# Altium footprint library iMag.PcbLib: 77 footprints (part 3 of 5)
Each footprint in its own frame and in the unit in brackets; x right, y up, seen from the top. Pads: shape width x height; smd on the part's side, far side on the other; paste and mask are expansions set on the pad; w line width, h text height; cw(c..) or ccw(c..) is an arc to the next point about the centre after c.
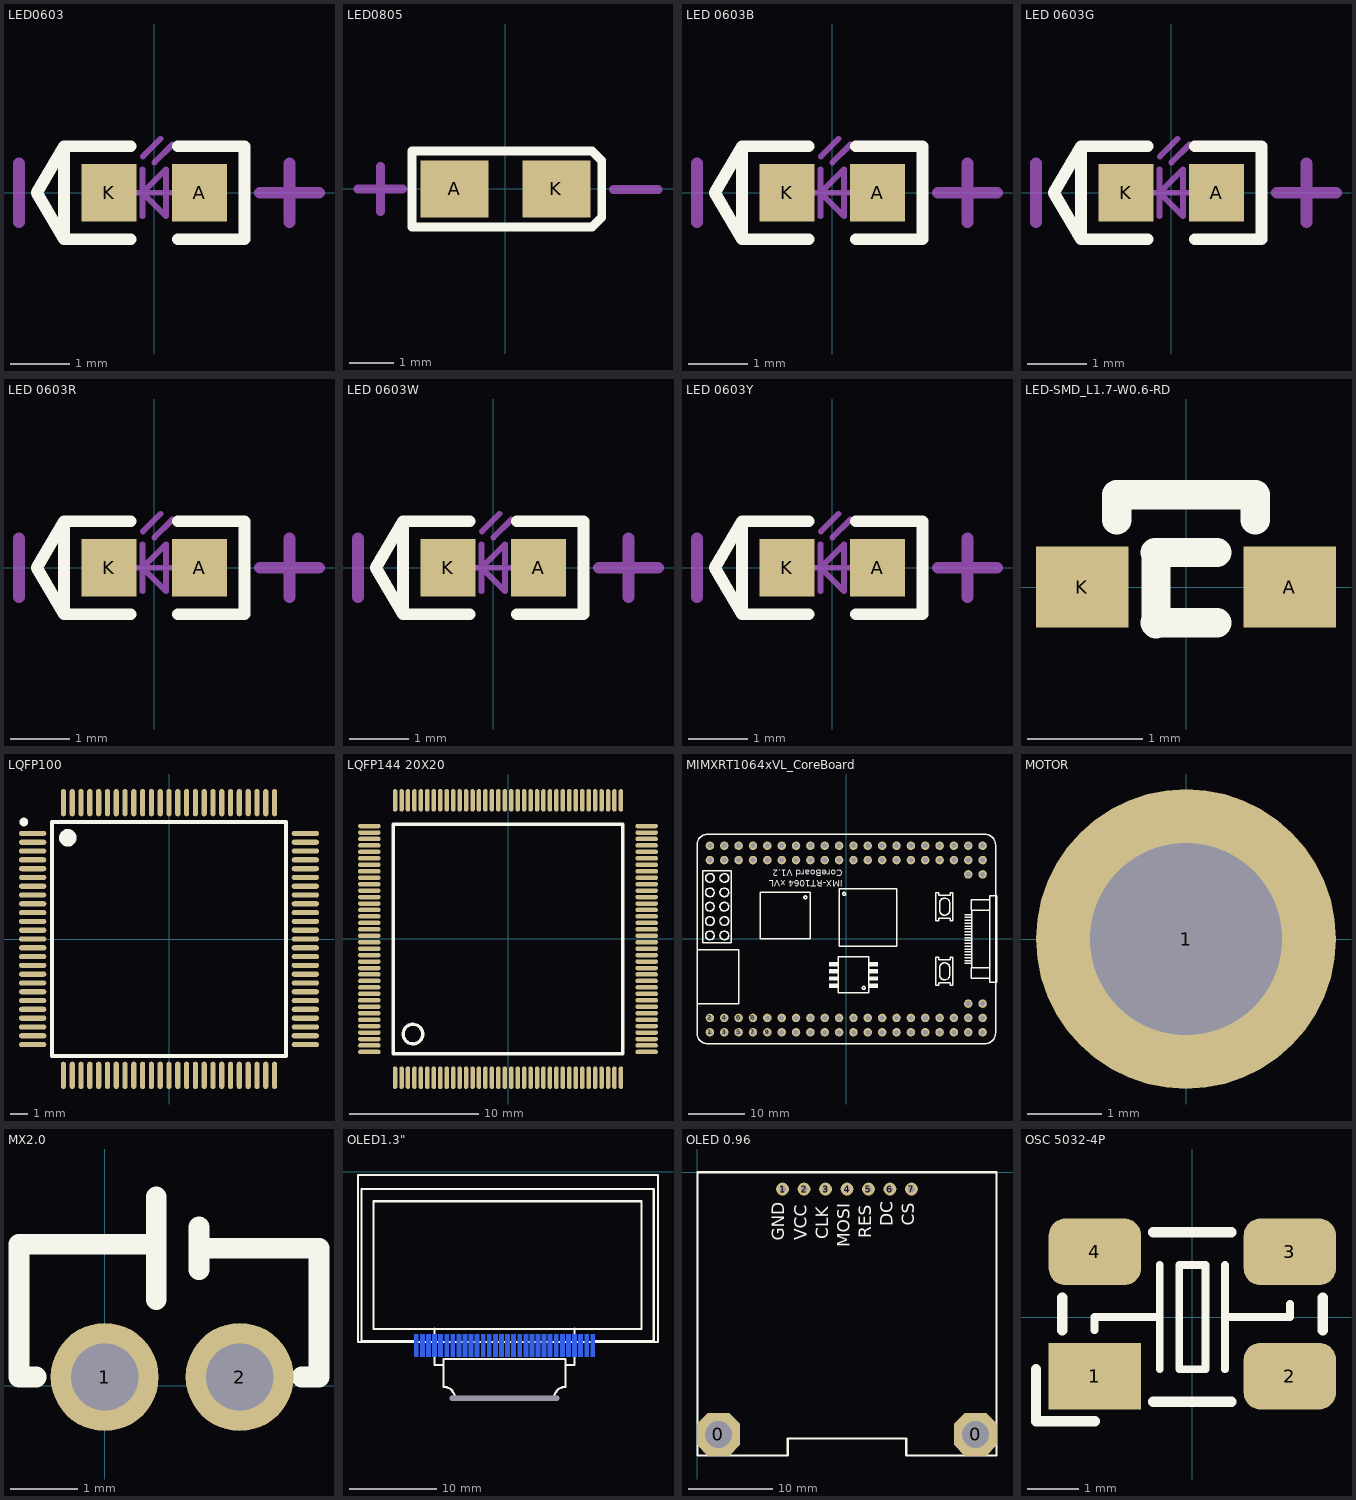
[diagram p2: the footprints below, top view; thin cyan lines are the x and y axes]

## LED0603 [mm]
pads (2):
  rect 0.93x0.98 smd: A(0.77,0) K(-0.77,0)
Top Overlay:
  lines w0.2: -0.4,-0.79 -1.535,-0.79 ; -0.4,0.79 -1.535,0.79 ; 0.4,-0.79 1.535,-0.79 1.535,0.79 0.4,0.79 ; -1.535,-0.79 -2,0 -1.535,0.79 ; -1.535,-0.79 -1.535,0.79
Mechanical 13:
  lines w0.1: -0.4,0 0.4,0 ; -0.2,-0.4 -0.2,0.4 ; -0.195,0.617 0.105,0.917 ; 0.005,0.517 0.305,0.817 ; -0.2,0 0.2,0.4 0.2,-0.4 -0.2,0
Mechanical 15:
  lines w0.203: -2.3,-0.5 -2.3,0.5 ; 1.8,0 2.8,0 ; 2.3,-0.5 2.3,0.5
3D body "User Library-LED_0603_R.STEP": height 0.6, standoff 0, extent -0.8,-0.4 0.8,0.4

## LED0805 [mil]
pads (2):
  rect 60x50 smd: A(-45,0) K(45,0)
Top Overlay:
  lines w7.87: -82.68,-33.46 76.54,-33.46 85,-25 85,25 76.54,33.46 75,33.46 -82.68,33.46 -82.68,-33.46
Mechanical 15:
  lines w8: -130.24,0 -90.87,0 ; -110.55,-19.69 -110.55,19.68 ; 95.31,-0.55 134.68,-0.55
3D body "User Library-LED SMD0805.step": height 33.45, standoff 0.23, extent -40.6,-17.84 40.6,17.84

## LED 0603B [mm] "蓝色0603LED"
pads (2):
  rect 0.93x0.98 smd: A(0.77,0) K(-0.77,0)
Top Overlay:
  lines w0.2: -0.4,-0.79 -1.535,-0.79 ; -0.4,0.79 -1.535,0.79 ; 0.4,-0.79 1.535,-0.79 1.535,0.79 0.4,0.79 ; -1.535,-0.79 -1.535,0.79 ; -1.535,-0.79 -2,0 -1.535,0.79
Mechanical 13:
  lines w0.1: -0.4,0 0.4,0 ; -0.2,-0.4 -0.2,0.4 ; -0.195,0.617 0.105,0.917 ; 0.005,0.517 0.305,0.817 ; -0.2,0 0.2,-0.4 0.2,0.4 -0.2,0
Mechanical 15:
  lines w0.203: -2.3,-0.5 -2.3,0.5 ; 1.8,0 2.8,0 ; 2.3,-0.5 2.3,0.5
3D body "LED 0603-B.STEP": height 0.47, standoff 0, extent -0.8,-0.401 0.8,0.401
3D body "LED 0603玻璃罩.STEP": height 0.61, standoff 0.21, extent -0.599,-0.401 0.599,0.401

## LED 0603G [mm] "绿色0603LED"
pads (2):
  rect 0.93x0.98 smd: A(0.77,0) K(-0.77,0)
Top Overlay:
  lines w0.2: -0.4,-0.79 -1.535,-0.79 ; -0.4,0.79 -1.535,0.79 ; 0.4,-0.79 1.535,-0.79 1.535,0.79 0.4,0.79 ; -1.535,-0.79 -2,0 -1.535,0.79 ; -1.535,-0.79 -1.535,0.79
Mechanical 13:
  lines w0.1: -0.4,0 0.4,0 ; -0.2,-0.4 -0.2,0.4 ; -0.195,0.617 0.105,0.917 ; 0.005,0.517 0.305,0.817 ; -0.2,0 0.2,0.4 0.2,-0.4 -0.2,0
Mechanical 15:
  lines w0.203: -2.3,-0.5 -2.3,0.5 ; 1.8,0 2.8,0 ; 2.3,-0.5 2.3,0.5
3D body "LED 0603玻璃罩.STEP": height 0.61, standoff 0.21, extent -0.599,-0.401 0.599,0.401
3D body "LED 0603-G.STEP": height 0.47, standoff 0, extent -0.8,-0.401 0.8,0.401

## LED 0603R [mm] "红色0603LED"
pads (2):
  rect 0.93x0.98 smd: A(0.77,0) K(-0.77,0)
Top Overlay:
  lines w0.2: -0.4,-0.79 -1.535,-0.79 ; -0.4,0.79 -1.535,0.79 ; 0.4,-0.79 1.535,-0.79 1.535,0.79 0.4,0.79 ; -1.535,-0.79 -2,0 -1.535,0.79 ; -1.535,-0.79 -1.535,0.79
Mechanical 13:
  lines w0.1: -0.4,0 0.4,0 ; -0.2,-0.4 -0.2,0.4 ; -0.195,0.617 0.105,0.917 ; 0.005,0.517 0.305,0.817 ; -0.2,0 0.2,0.4 0.2,-0.4 -0.2,0
Mechanical 15:
  lines w0.203: -2.3,-0.5 -2.3,0.5 ; 1.8,0 2.8,0 ; 2.3,-0.5 2.3,0.5
3D body "LED 0603-R.STEP": height 0.47, standoff 0, extent -0.8,-0.401 0.8,0.401
3D body "LED 0603玻璃罩.STEP": height 0.61, standoff 0.21, extent -0.599,-0.401 0.599,0.401

## LED 0603W [mm] "白色0603LED"
pads (2):
  rect 0.93x0.98 smd: A(0.77,0) K(-0.77,0)
Top Overlay:
  lines w0.2: -0.4,-0.79 -1.535,-0.79 ; -0.4,0.79 -1.535,0.79 ; 0.4,-0.79 1.535,-0.79 1.535,0.79 0.4,0.79 ; -1.535,-0.79 -2,0 -1.535,0.79 ; -1.535,-0.79 -1.535,0.79
Mechanical 13:
  lines w0.1: -0.4,0 0.4,0 ; -0.2,-0.4 -0.2,0.4 ; -0.195,0.617 0.105,0.917 ; 0.005,0.517 0.305,0.817 ; -0.2,0 0.2,0.4 0.2,-0.4 -0.2,0
Mechanical 15:
  lines w0.203: -2.3,-0.5 -2.3,0.5 ; 1.8,0 2.8,0 ; 2.3,-0.5 2.3,0.5
3D body "LED 0603玻璃罩.STEP": height 0.61, standoff 0.21, extent -0.599,-0.401 0.599,0.401
3D body "LED 0603-W.STEP": height 0.47, standoff 0, extent -0.8,-0.401 0.8,0.401

## LED 0603Y [mm] "黄色0603LED"
pads (2):
  rect 0.93x0.98 smd: A(0.77,0) K(-0.77,0)
Top Overlay:
  lines w0.2: -0.4,-0.79 -1.535,-0.79 ; -0.4,0.79 -1.535,0.79 ; 0.4,-0.79 1.535,-0.79 1.535,0.79 0.4,0.79 ; -1.535,-0.79 -2,0 -1.535,0.79 ; -1.535,-0.79 -1.535,0.79
Mechanical 13:
  lines w0.1: -0.4,0 0.4,0 ; -0.2,-0.4 -0.2,0.4 ; -0.195,0.617 0.105,0.917 ; 0.005,0.517 0.305,0.817 ; -0.2,0 0.2,0.4 0.2,-0.4 -0.2,0
Mechanical 15:
  lines w0.203: -2.3,-0.5 -2.3,0.5 ; 1.8,0 2.8,0 ; 2.3,-0.5 2.3,0.5
3D body "LED 0603玻璃罩.STEP": height 0.61, standoff 0.21, extent -0.599,-0.401 0.599,0.401
3D body "LED 0603-Y.STEP": height 0.47, standoff 0, extent -0.8,-0.408 0.8,0.395

## LED-SMD_L1.7-W0.6-RD [mm]
pads (2):
  rect 0.8x0.7 smd: A(0.9,0) K(-0.9,0)
Top Overlay:
  lines w0.254: -0.6,0.581 -0.6,0.8 0.6,0.8 0.6,0.581 ; -0.269,-0.31 0.269,-0.31 ; -0.269,0.3 0.269,0.3 ; -0.26,-0.32 -0.26,0.279
3D body "LED 0603玻璃罩.STEP": height 0.61, standoff 0.21, extent -0.599,-0.401 0.599,0.401
3D body "LED 0603-G.STEP": height 0.47, standoff 0, extent -0.8,-0.401 0.8,0.401

## LQFP100 [mm] "100-pin low-profile quad flat"
pads (100):
  oval 1.55x0.3 smd: 1(-7.75,6) 2(-7.75,5.5) 3(-7.75,5) 4(-7.75,4.5) 5(-7.75,4) 6(-7.75,3.5) 7(-7.75,3) 8(-7.75,2.5) 9(-7.75,2) 10(-7.75,1.5) 11(-7.75,1) 12(-7.75,0.5) 13(-7.75,0) 14(-7.75,-0.5) 15(-7.75,-1) 16(-7.75,-1.5) 17(-7.75,-2) 18(-7.75,-2.5) 19(-7.75,-3) 20(-7.75,-3.5) 21(-7.75,-4) 22(-7.75,-4.5) 23(-7.75,-5) 24(-7.75,-5.5) 25(-7.75,-6) 51(7.75,-6) 52(7.75,-5.5) 53(7.75,-5) 54(7.75,-4.5) 55(7.75,-4) 56(7.75,-3.5) 57(7.75,-3) 58(7.75,-2.5) 59(7.75,-2) 60(7.75,-1.5) 61(7.75,-1) 62(7.75,-0.5) 63(7.75,0) 64(7.75,0.5) 65(7.75,1) 66(7.75,1.5) 67(7.75,2) 68(7.75,2.5) 69(7.75,3) 70(7.75,3.5) 71(7.75,4) 72(7.75,4.5) 73(7.75,5) 74(7.75,5.5) 75(7.75,6)
  oval 0.3x1.55 smd: 26(-6,-7.75) 27(-5.5,-7.75) 28(-5,-7.75) 29(-4.5,-7.75) 30(-4,-7.75) 31(-3.5,-7.75) 32(-3,-7.75) 33(-2.5,-7.75) 34(-2,-7.75) 35(-1.5,-7.75) 36(-1,-7.75) 37(-0.5,-7.75) 38(0,-7.75) 39(0.5,-7.75) 40(1,-7.75) 41(1.5,-7.75) 42(2,-7.75) 43(2.5,-7.75) 44(3,-7.75) 45(3.5,-7.75) 46(4,-7.75) 47(4.5,-7.75) 48(5,-7.75) 49(5.5,-7.75) 50(6,-7.75) 76(6,7.75) 77(5.5,7.75) 78(5,7.75) 79(4.5,7.75) 80(4,7.75) 81(3.5,7.75) 82(3,7.75) 83(2.5,7.75) 84(2,7.75) 85(1.5,7.75) 86(1,7.75) 87(0.5,7.75) 88(0,7.75) 89(-0.5,7.75) 90(-1,7.75) 91(-1.5,7.75) 92(-2,7.75) 93(-2.5,7.75) 94(-3,7.75) 95(-3.5,7.75) 96(-4,7.75) 97(-4.5,7.75) 98(-5,7.75) 99(-5.5,7.75) 100(-6,7.75)
Top Overlay:
  circle w0.25: c-8.25,6.65 r0.125
  circle w0.5: c-5.75,5.75 r0.25
  lines w0.2: -6.65,-6.65 6.65,-6.65 6.65,6.65 -6.65,6.65 -6.65,-6.65
3D body "User Library-LQFP100.step": height 1.6, standoff 0, extent -8,-8 8,8

## LQFP144 20X20 [mm]
height 1.1
pads (144):
  oval 0.35x1.753 smd: 1(-8.75,-10.747) 2(-8.25,-10.747) 3(-7.75,-10.747) 4(-7.25,-10.747) 5(-6.75,-10.747) 6(-6.25,-10.747) 7(-5.75,-10.747) 8(-5.25,-10.747) 9(-4.75,-10.747) 10(-4.25,-10.747) 11(-3.75,-10.747) 12(-3.25,-10.747) 13(-2.75,-10.747) 14(-2.25,-10.747) 15(-1.75,-10.747) 16(-1.25,-10.747) 17(-0.75,-10.747) 18(-0.25,-10.747) 19(0.25,-10.747) 20(0.75,-10.747) 21(1.25,-10.747) 22(1.75,-10.747) 23(2.25,-10.747) 24(2.75,-10.747) 25(3.25,-10.747) 26(3.75,-10.747) 27(4.25,-10.747) 28(4.75,-10.747) 29(5.25,-10.747) 30(5.75,-10.747) 31(6.25,-10.747) 32(6.75,-10.747) 33(7.25,-10.747) 34(7.75,-10.747) 35(8.25,-10.747) 36(8.75,-10.747) 73(8.75,10.747) 74(8.25,10.747) 75(7.75,10.747) 76(7.25,10.747) 77(6.75,10.747) 78(6.25,10.747) 79(5.75,10.747) 80(5.25,10.747) 81(4.75,10.747) 82(4.25,10.747) 83(3.75,10.747) 84(3.25,10.747) 85(2.75,10.747) 86(2.25,10.747) 87(1.75,10.747) 88(1.25,10.747) 89(0.75,10.747) 90(0.25,10.747) 91(-0.25,10.747) 92(-0.75,10.747) 93(-1.25,10.747) 94(-1.75,10.747) 95(-2.25,10.747) 96(-2.75,10.747) 97(-3.25,10.747) 98(-3.75,10.747) 99(-4.25,10.747) 100(-4.75,10.747) 101(-5.25,10.747) 102(-5.75,10.747) 103(-6.25,10.747) 104(-6.75,10.747) 105(-7.25,10.747) 106(-7.75,10.747) 107(-8.25,10.747) 108(-8.75,10.747)
  oval 1.753x0.35 smd: 37(10.747,-8.75) 38(10.747,-8.25) 39(10.747,-7.75) 40(10.747,-7.25) 41(10.747,-6.75) 42(10.747,-6.25) 43(10.747,-5.75) 44(10.747,-5.25) 45(10.747,-4.75) 46(10.747,-4.25) 47(10.747,-3.75) 48(10.747,-3.25) 49(10.747,-2.75) 50(10.747,-2.25) 51(10.747,-1.75) 52(10.747,-1.25) 53(10.747,-0.75) 54(10.747,-0.25) 55(10.747,0.25) 56(10.747,0.75) 57(10.747,1.25) 58(10.747,1.75) 59(10.747,2.25) 60(10.747,2.75) 61(10.747,3.25) 62(10.747,3.75) 63(10.747,4.25) 64(10.747,4.75) 65(10.747,5.25) 66(10.747,5.75) 67(10.747,6.25) 68(10.747,6.75) 69(10.747,7.25) 70(10.747,7.75) 71(10.747,8.25) 72(10.747,8.75) 109(-10.747,8.75) 110(-10.747,8.25) 111(-10.747,7.75) 112(-10.747,7.25) 113(-10.747,6.75) 114(-10.747,6.25) 115(-10.747,5.75) 116(-10.747,5.25) 117(-10.747,4.75) 118(-10.747,4.25) 119(-10.747,3.75) 120(-10.747,3.25) 121(-10.747,2.75) 122(-10.747,2.25) 123(-10.747,1.75) 124(-10.747,1.25) 125(-10.747,0.75) 126(-10.747,0.25) 127(-10.747,-0.25) 128(-10.747,-0.75) 129(-10.747,-1.25) 130(-10.747,-1.75) 131(-10.747,-2.25) 132(-10.747,-2.75) 133(-10.747,-3.25) 134(-10.747,-3.75) 135(-10.747,-4.25) 136(-10.747,-4.75) 137(-10.747,-5.25) 138(-10.747,-5.75) 139(-10.747,-6.25) 140(-10.747,-6.75) 141(-10.747,-7.25) 142(-10.747,-7.75) 143(-10.747,-8.25) 144(-10.747,-8.75)
Top Overlay:
  circle w0.254: c-7.366,-7.366 r0.762
  lines w0.254: -8.89,-8.892 8.89,-8.892 8.89,8.89 -8.89,8.89 -8.89,-8.892
3D body "LQFP144 20X20.STEP": height 1.45, standoff 0, extent -11.024,-11.003 10.982,11.003

## MIMXRT1064xVL_CoreBoard [mm] "逐飞科技i.MX RT1064核心板整体封装，可直接使用"
pads (84):
  round 1.5 hole 0.9: 1(-24.13,-16.51) 2(-24.13,-13.97) 3(-21.59,-16.51) 4(-21.59,-13.97) 5(-19.05,-16.51) 6(-19.05,-13.97) 7(-16.51,-16.51) 8(-16.51,-13.97) 9(-13.97,-16.51) 10(-13.97,-13.97) 11(-11.43,-16.51) 12(-11.43,-13.97) 13(-8.89,-16.51) 14(-8.89,-13.97) 15(-6.35,-16.51) 16(-6.35,-13.97) 17(-3.81,-16.51) 18(-3.81,-13.97) 19(-1.27,-16.51) 20(-1.27,-13.97) 21(1.27,-16.51) 22(1.27,-13.97) 23(3.81,-16.51) 24(3.81,-13.97) 25(6.35,-16.51) 26(6.35,-13.97) 27(8.89,-16.51) 28(8.89,-13.97) 29(11.43,-16.51) 30(11.43,-13.97) 31(13.97,-16.51) 32(13.97,-13.97) 33(16.51,-16.51) 34(16.51,-13.97) 35(19.05,-16.51) 36(19.05,-13.97) 37(21.59,-16.51) 38(21.59,-13.97) 39(24.13,-16.51) 40(24.13,-13.97) 41(21.59,-11.43) 42(24.13,-11.43) 43(24.13,11.43) 44(21.59,11.43) 45(24.13,13.97) 46(24.13,16.51) 47(21.59,13.97) 48(21.59,16.51) 49(19.05,13.97) 50(19.05,16.51) 51(16.51,13.97) 52(16.51,16.51) 53(13.97,13.97) 54(13.97,16.51) 55(11.43,13.97) 56(11.43,16.51) 57(8.89,13.97) 58(8.89,16.51) 59(6.35,13.97) 60(6.35,16.51) 61(3.81,13.97) 62(3.81,16.51) 63(1.27,13.97) 64(1.27,16.51) 65(-1.27,13.97) 66(-1.27,16.51) 67(-3.81,13.97) 68(-3.81,16.51) 69(-6.35,13.97) 70(-6.35,16.51) 71(-8.89,13.97) 72(-8.89,16.51) 73(-11.43,13.97) 74(-11.43,16.51) 75(-13.97,13.97) 76(-13.97,16.51) 77(-16.51,13.97) 78(-16.51,16.51) 79(-19.05,13.97) 80(-19.05,16.51) 81(-21.59,13.97) 82(-21.59,16.51) 83(-24.13,13.97) 84(-24.13,16.51)
Top Overlay:
  circle w0.254: c-21.59,0.635 r0.762
  circle w0.254: c-24.13,0.635 r0.762
  circle w0.254: c-21.59,10.795 r0.762
  circle w0.254: c-24.13,10.795 r0.762
  circle w0.254: c-21.59,3.175 r0.762
  circle w0.254: c-24.13,3.175 r0.762
  circle w0.254: c-21.59,5.715 r0.762
  circle w0.254: c-21.59,8.255 r0.762
  circle w0.254: c-24.13,8.255 r0.762
  circle w0.254: c-24.13,5.715 r0.762
  circle w0.254: c-0.381,8.001 r0.254
  circle w0.254: c-7.239,7.366 r0.254
  circle w0.254: c3.081,-8.636 r0.254
  lines w0.254: -26.416,-11.43 -19.05,-11.43 -19.05,-1.905 -26.416,-1.905 ; -3.048,-8.509 -1.43,-8.509 ; -3.048,-8.255 -1.43,-8.255 ; -3.048,-8.001 -1.43,-8.001 ; -3.048,-7.239 -1.43,-7.239 ; -3.048,-6.985 -1.43,-6.985 ; -3.048,-6.731 -1.43,-6.731 ; -3.048,-5.969 -1.43,-5.969 ; -3.048,-5.715 -1.43,-5.715 ; -3.048,-5.461 -1.43,-5.461 ; -3.048,-4.699 -1.43,-4.699 ; -3.048,-4.445 -1.43,-4.445 ; -3.048,-4.191 -1.43,-4.191 ; 3.97,-8.509 5.588,-8.509 ; 3.97,-8.255 5.588,-8.255 ; 3.97,-8.001 5.588,-8.001 ; 3.97,-7.239 5.588,-7.239 ; 3.97,-6.985 5.588,-6.985 ; 3.97,-6.731 5.588,-6.731 ; 3.97,-5.969 5.588,-5.969 ; 3.97,-5.715 5.588,-5.715 ; 3.97,-5.461 5.588,-5.461 ; 3.97,-4.699 5.588,-4.699 ; 3.97,-4.445 5.588,-4.445 ; 3.97,-4.191 5.588,-4.191 ; 20.955,-4.318 22.225,-4.318 ; 20.955,-3.81 22.225,-3.81 ; 20.955,-3.302 22.225,-3.302 ; 20.955,-2.794 22.225,-2.794 ; 20.955,-2.286 22.225,-2.286 ; 20.955,-1.778 22.225,-1.778 ; 20.955,-1.27 22.225,-1.27 ; 20.955,-0.762 22.225,-0.762 ; 20.955,-0.254 22.225,-0.254 ; 20.955,0.254 22.225,0.254 ; 20.955,0.762 22.225,0.762 ; 20.955,1.27 22.225,1.27 ; 20.955,1.778 22.225,1.778 ; 20.955,2.286 22.225,2.286 ; 20.955,2.794 22.225,2.794 ; 20.955,3.302 22.225,3.302 ; 20.955,3.81 22.225,3.81 ; 20.955,4.318 22.225,4.318 ; 22.225,-5.08 22.225,5.08 ; 25.4,-6.985 22.098,-6.985 22.098,-5.08 25.4,-5.08 ; 25.4,5.08 22.098,5.08 22.098,6.985 25.4,6.985 ; -26.416,-16.637 ccw(c-24.511,-16.637) -24.511,-18.542 24.511,-18.542 ccw(c24.511,-16.637) 26.416,-16.637 26.416,16.637 ccw(c24.511,16.637) 24.511,18.542 -24.511,18.542 ccw(c-24.511,16.637) -26.416,16.637 -26.416,-16.637 ; -25.4,-0.635 -20.32,-0.635 -20.32,12.065 -25.4,12.065 -25.4,-0.635 ; -15.24,0 -6.35,0 -6.35,8.255 -15.24,8.255 -15.24,0 ; -1.43,-9.525 -1.43,-3.175 3.97,-3.175 3.97,-9.525 -1.43,-9.525 ; -1.27,-1.27 -1.27,8.89 8.89,8.89 8.89,-1.27 -1.27,-1.27 ; 15.872,-8.199 15.872,-7.715 15.872,-3.715 15.872,-3.231 16.356,-3.231 16.356,-3.715 18.388,-3.715 18.388,-3.231 18.872,-3.231 18.872,-3.715 18.872,-7.715 18.872,-8.199 18.388,-8.199 18.388,-7.715 16.356,-7.715 16.356,-8.199 15.872,-8.199 ; 15.872,3.231 16.356,3.231 16.356,3.715 18.388,3.715 18.388,3.231 18.872,3.231 18.872,3.715 18.872,7.715 18.872,8.199 18.388,8.199 18.388,7.715 16.356,7.715 16.356,8.199 15.872,8.199 15.872,7.715 15.872,3.715 15.872,3.231 ; 16.51,-6.35 ccw(c17.399,-6.35) 18.288,-6.35 18.288,-5.08 ccw(c17.399,-5.08) 16.51,-5.08 16.51,-6.35 ; 16.51,5.08 ccw(c17.399,5.08) 18.288,5.08 18.288,6.35 ccw(c17.399,6.35) 16.51,6.35 16.51,5.08 ; 25.4,-7.62 26.67,-7.62 26.67,7.62 25.4,7.62 25.4,-7.62
  text "CoreBoard V1.2" at -0.635,12.7 h2.03
  text "IMX-RT1064 xVL" at -0.635,10.795 h2.03
3D body "IDC36.STEP": height 8.5, standoff -3.35, extent -25.4,-17.74 20.32,-12.74
3D body "IDC36.STEP": height 8.5, standoff -3.35, extent -25.273,12.74 20.447,17.74
3D body "IDC6.STEP": height 8.5, standoff -3.35, extent 20.36,-17.78 25.36,-10.16
3D body "IDC6.STEP": height 8.5, standoff -3.35, extent 20.487,10.16 25.487,17.78

## MOTOR [mil] "镀金香蕉头2mm"
pads (1):
  round 160 hole 102.36: 1(0,0)

## MX2.0 [mm] "空对空"
pads (2):
  round 1.6 hole 1: 1(0,0.127) 2(2,0.127)
Top Overlay:
  lines w0.305: -1.016,0.127 -1.27,0.127 -1.27,2.095 0.28,2.095 0.762,2.095 ; 0.762,1.27 0.762,1.746 0.762,2.445 0.762,2.794 ; 1.397,1.714 1.397,2.349 ; 1.397,2.032 3.175,2.032 3.175,0.127 2.921,0.127

## OLED1.3" [mm] "OLED_UG-9664HDDAG01"
pads (31):
  rrect50% 0x0 hole 12.6 slot 0.6 at 90 deg unplated: 0(36.957,-26.035)
  rrect50% 0.5x2.6 smd far side: 1(26.81,-19.965)
  rect 0.5x2.6 smd far side: 2(27.509,-19.966) 3(28.21,-19.965) 4(28.91,-19.965) 5(29.61,-19.965) 6(30.31,-19.965) 7(31.01,-19.965) 8(31.71,-19.965) 9(32.41,-19.965) 10(33.11,-19.965) 11(33.81,-19.965) 12(34.51,-19.965) 13(35.21,-19.965) 14(35.91,-19.965) 15(36.611,-19.965) 16(37.31,-19.965) 17(38.01,-19.965) 18(38.71,-19.965) 19(39.411,-19.966) 20(40.11,-19.965) 21(40.811,-19.964) 22(41.51,-19.965) 23(42.209,-19.965) 24(42.91,-19.965) 25(43.61,-19.966) 26(44.31,-19.965) 27(45.011,-19.966) 28(45.71,-19.965) 29(46.411,-19.965) 30(47.11,-19.965)
Top Overlay:
  lines w0.254: 26.802,-19.483 26.102,-19.483 20.515,-19.483 20.515,-1.983 54.115,-1.983 54.115,-19.483 47.102,-19.483 ; 28.908,-18.034 28.908,-22.235 29.957,-22.235 ; 29.957,-24.734 cw(c29.957,-26.034) 31.257,-26.035 ; 29.957,-24.685 29.957,-23.355 ; 29.957,-23.285 29.957,-21.535 43.957,-21.535 43.957,-23.285 ; 42.657,-26.035 cw(c43.957,-26.035) 43.957,-24.735 ; 43.957,-24.685 43.957,-23.355 ; 43.957,-22.235 45.007,-22.235 ; 44.656,-22.235 45.006,-22.235 45.006,-18.034 ; 20.11,-19.581 20.11,-0.381 54.61,-0.381 54.61,-19.581 20.11,-19.581 ; 21.902,-18.083 21.902,-3.383 52.702,-3.383 52.702,-18.083 21.902,-18.083
3D body "User Library-OLED-1_3C.step": height 3.83, standoff -0.88, extent 19.729,-26.416 54.229,-0.328

## OLED 0.96 [mil]
pads (9):
  oct 200x200 hole 125.98: 0(98.43,-1220.47) 0(1295.28,-1220.47)
  round 60 hole 30: 1(396.85,-78.74) 2(496.85,-78.74) 3(596.85,-78.74) 4(696.85,-78.74) 5(796.85,-78.74) 6(896.85,-78.74) 7(996.85,-78.74)
Top Overlay:
  lines w10: 419.8,-1318.9 0,-1318.9 0,0 1393.7,0 1393.7,-1318.9 972.44,-1318.9 972.44,-1240.16 421.26,-1240.16 421.26,-1318.9
  text "CS" at 1029.79,-249.08 h100
  text "DC" at 929.79,-251.49 h100
  text "RES" at 829.79,-306.43 h100
  text "MOSI" at 729.79,-350 h100
  text "CLK" at 629.79,-312.91 h100
  text "VCC" at 529.79,-317.72 h100
  text "GND" at 425,-320 h100
3D body "OLED带PCB.step": height 333.57, standoff -93.43, extent 215,-1083.43 1266.18,13.43

## OSC 5032-4P [mm]
height 1.1
pads (4):
  rect 1.8x1.3 smd: 1(-1.9,-1.15)
  rrect50% 1.8x1.3 smd: 2(1.9,-1.15) 3(1.9,1.272) 4(-1.9,1.272)
Top Overlay:
  lines w0.152: -1.905,-0.254 -1.905,0 -1.397,0 -0.635,0 ; -0.635,-1.016 -0.635,1.016 ; 0.635,-1.016 0.635,1.016 ; 0.635,0 1.397,0 1.905,0 1.905,0.254 ; -0.254,-1.016 0.254,-1.016 0.254,1.016 -0.254,1.016 -0.254,-1.016
  lines w0.203: -3.048,-1.016 -3.048,-2.032 -1.905,-2.032 ; -2.54,-0.254 -2.54,0.381 ; -0.762,-1.651 0.762,-1.651 ; -0.762,1.651 0.762,1.651 ; 2.54,-0.254 2.54,0.381
3D body "OSC 5032-4P.STEP": height 0.86, standoff 0.03, extent -2.5,-1.651 2.5,1.549